# Altium footprint library HARTING THD.PcbLib: 113 footprints (part 7 of 11)
Each footprint in its own frame and in the unit in brackets; x right, y up, seen from the top. Pads: shape width x height; smd on the part's side, far side on the other; paste and mask are expansions set on the pad; w line width, h text height; cw(c..) or ccw(c..) is an arc to the next point about the centre after c.
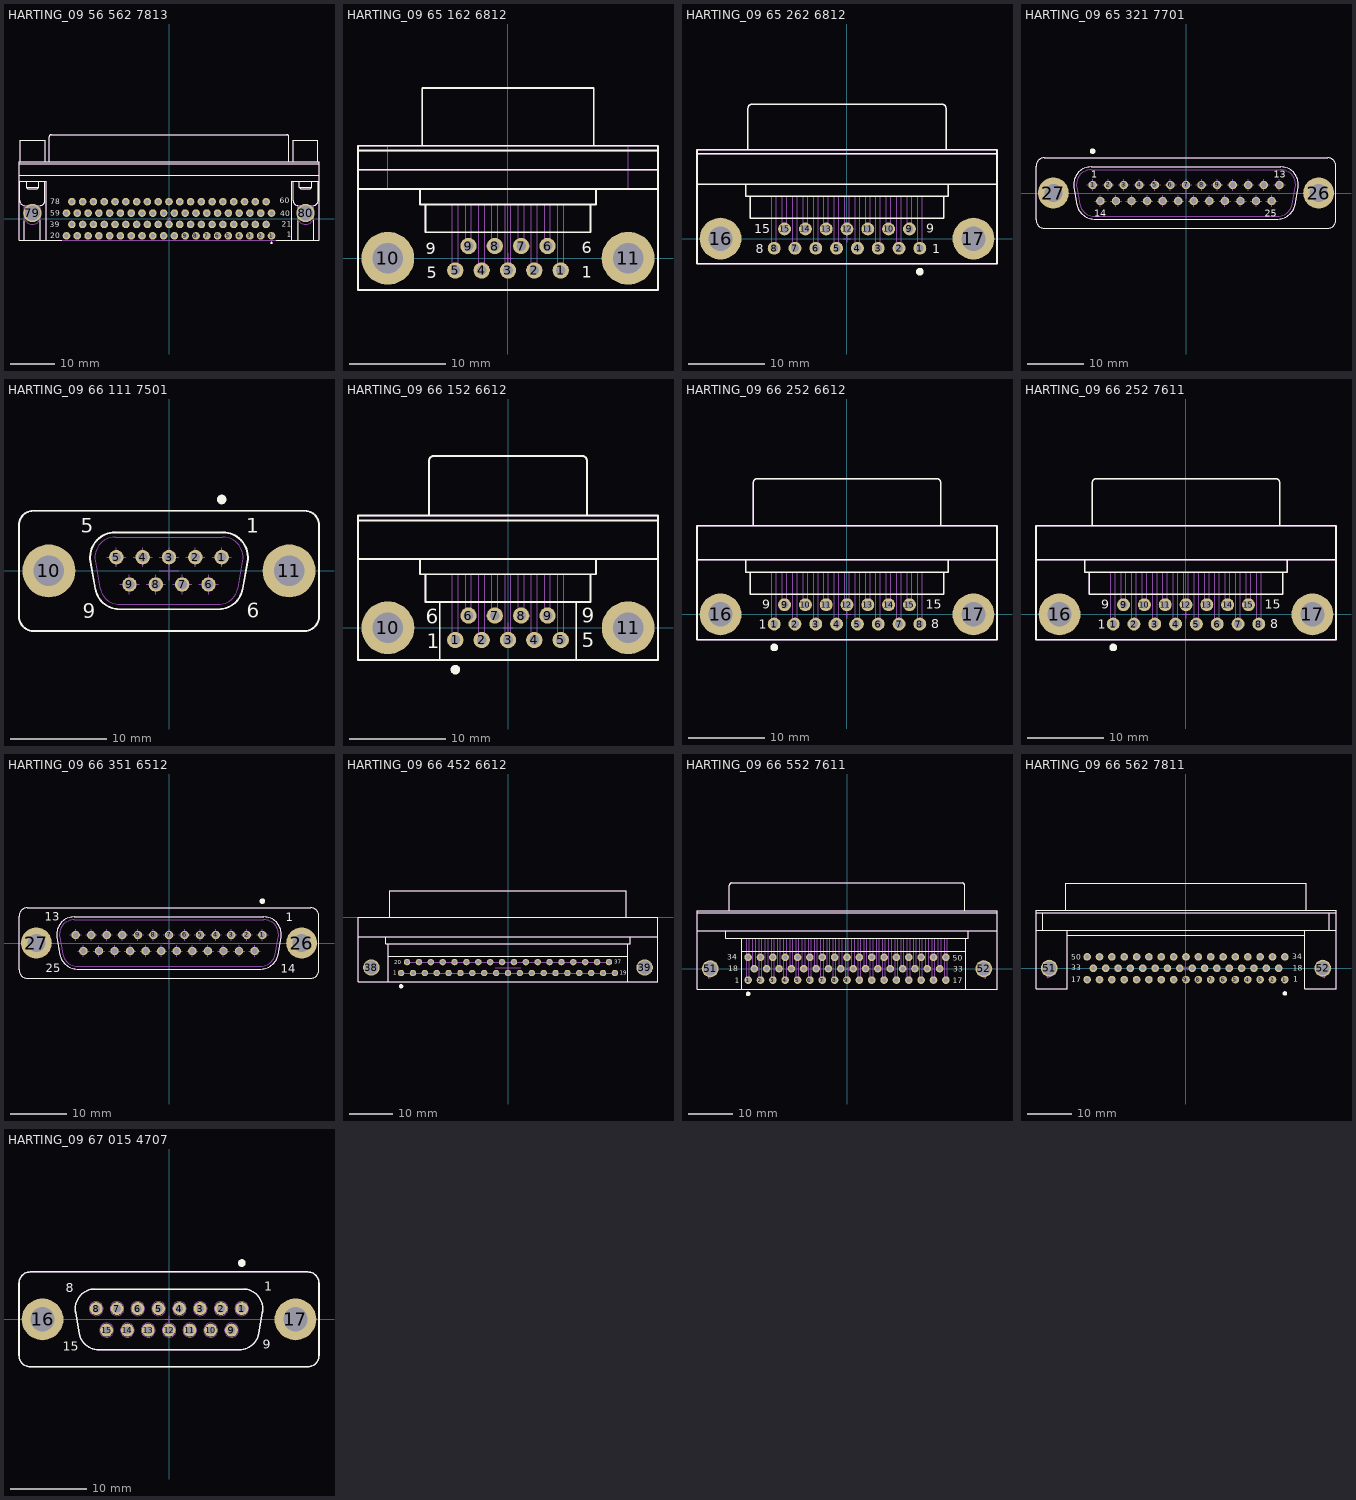
[diagram p6: the footprints below, top view; thin cyan lines are the x and y axes]

## HARTING_09 56 562 7813 [mm] "High Density Right Angle Male D-SUB 78 Contacts, with Grounding Board Locks and Female Screw Lock 4-40"
height 15.37
pads (80):
  round 1.7 hole 1: 1(22.895,-3.81) 2(20.485,-3.81) 3(18.075,-3.81) 4(15.665,-3.81) 5(13.255,-3.81) 6(10.845,-3.81) 7(8.435,-3.81) 8(6.025,-3.81) 9(3.615,-3.81) 10(1.205,-3.81) 11(-1.205,-3.81) 12(-3.615,-3.81) 13(-6.025,-3.81) 14(-8.435,-3.81) 15(-10.845,-3.81) 16(-13.255,-3.81) 17(-15.665,-3.81) 18(-18.075,-3.81) 19(-20.485,-3.81) 20(-22.895,-3.81) 21(21.685,-1.27) 22(19.275,-1.27) 23(16.865,-1.27) 24(14.455,-1.27) 25(12.045,-1.27) 26(9.635,-1.27) 27(7.225,-1.27) 28(4.815,-1.27) 29(2.405,-1.27) 30(-0.005,-1.27) 31(-2.415,-1.27) 32(-4.825,-1.27) 33(-7.235,-1.27) 34(-9.645,-1.27) 35(-12.055,-1.27) 36(-14.465,-1.27) 37(-16.875,-1.27) 38(-19.285,-1.27) 39(-21.695,-1.27) 40(22.895,1.27) 41(20.485,1.27) 42(18.075,1.27) 43(15.665,1.27) 44(13.255,1.27) 45(10.845,1.27) 46(8.435,1.27) 47(6.025,1.27) 48(3.615,1.27) 49(1.205,1.27) 50(-1.205,1.27) 51(-3.615,1.27) 52(-6.025,1.27) 53(-8.435,1.27) 54(-10.845,1.27) 55(-13.255,1.27) 56(-15.665,1.27) 57(-18.075,1.27) 58(-20.485,1.27) 59(-22.895,1.27) 60(21.685,3.81) 61(19.275,3.81) 62(16.865,3.81) 63(14.455,3.81) 64(12.045,3.81) 65(9.635,3.81) 66(7.225,3.81) 67(4.815,3.81) 68(2.405,3.81) 69(-0.005,3.81) 70(-2.415,3.81) 71(-4.825,3.81) 72(-7.235,3.81) 73(-9.645,3.81) 74(-12.055,3.81) 75(-14.465,3.81) 76(-16.875,3.81) 77(-19.285,3.81) 78(-21.695,3.81)
  round 4.1 hole 3.4: 79(-30.505,1.27) 80(30.495,1.27)
Top Overlay:
  circle w0.2: c22.895,-5.386 r0.125
  lines w0.2: -33.5,8.4 -27.45,8.4 -27.45,-4.8 ; -33.5,9.7 33.5,9.7 ; -33.5,12.3 33.5,12.3 ; -33.3,8.4 -33.3,4.02 ccw(c-32.3,4.02) -32.3,3.02 ; -33.243,12.7 -33.243,17.499 -27.758,17.499 -27.758,12.7 ; -32.3,-4.8 -32.3,-0.398 ; -31.9,8.4 -31.9,7 ; -29.1,8.4 -29.1,7 ; -28.7,-4.8 -28.7,-0.387 ; -28.7,3.02 ccw(c-28.7,4.02) -27.7,4.02 -27.7,8.4 ; -26.759,12.7 -26.759,18.3 cw(c-26.259,18.3) -26.259,18.8 26.259,18.8 cw(c26.259,18.3) 26.759,18.3 26.759,12.7 ; -23.925,-4.8 -33.5,-4.8 -33.5,12.7 33.5,12.7 33.5,-4.8 23.925,-4.8 ; 27.45,-4.8 27.45,8.4 33.5,8.4 ; 27.7,8.4 27.7,4.02 ccw(c28.7,4.02) 28.7,3.02 ; 27.757,12.7 27.757,17.499 33.242,17.499 33.242,12.7 ; 28.7,-4.8 28.7,-0.398 ; 29.1,8.4 29.1,7 ; 31.9,8.4 31.9,7 ; 32.3,-4.8 32.3,-0.387 ; 32.3,3.02 ccw(c32.3,4.02) 33.3,4.02 33.3,8.4 ; -31.9,7 -29.1,7 ; -31.9,7 -31.6,6.7 -29.4,6.7 -29.1,7 ; 29.1,7 29.4,6.7 31.6,6.7 31.9,7 ; 29.1,7 31.9,7
  text "20" at -26.479,-4.302 h1.2
  text "39" at -26.579,-1.877 h1.2
  text "21" at 25.171,-1.787 h1.2
  text "59" at -26.504,0.703 h1.2
  text "40" at 24.846,0.608 h1.2
  text "78" at -26.529,3.263 h1.2
  text "60" at 24.771,3.408 h1.2
  text "1" at 26.246,-4.132 h1.2
Mechanical 8:
  drawing of 327 lines, arcs and shapes, not listed
Mechanical 14:
  lines w0.1: -33.5,8.4 -27.45,8.4 -27.45,-4.8 ; -33.5,9.7 33.5,9.7 ; -33.5,12.3 33.5,12.3 ; -33.3,8.4 -33.3,4.02 ccw(c-32.3,4.02) -32.3,3.02 ; -33.243,12.7 -33.243,17.499 -27.758,17.499 -27.758,12.7 ; -32.3,-4.8 -32.3,3.02 ; -32.3,0.55 ccw(c-30.5,0.55) -28.7,0.55 ; -32.3,1.02 -28.7,1.02 ; -32.3,1.52 -32.01,1.52 ; -32.3,2.05 cw(c-30.5,2.05) -32.016,3.02 ; -32.01,1.02 -32.01,3.02 ; -31.9,8.4 -31.9,7 ; -29.1,8.4 -29.1,7 ; -28.99,1.02 -28.99,3.02 ; -28.99,1.52 -28.7,1.52 ; -28.984,3.02 cw(c-30.5,2.05) -28.7,2.05 ; -28.7,-4.8 -28.7,3.02 ; -27.7,8.4 -27.7,4.02 cw(c-28.7,4.02) -28.7,3.02 ; -26.759,12.7 -26.759,18.3 cw(c-26.259,18.3) -26.259,18.8 26.259,18.8 cw(c26.259,18.3) 26.759,18.3 26.759,12.7 ; 27.45,-4.8 27.45,8.4 33.5,8.4 ; 27.7,4.02 ccw(c28.7,4.02) 28.7,3.02 ; 27.757,12.7 27.757,17.499 33.242,17.499 33.242,12.7 ; 28.7,-4.8 28.7,3.02 ; 28.7,0.55 ccw(c30.5,0.55) 32.3,0.55 ; 28.7,1.02 32.3,1.02 ; 28.7,1.52 28.978,1.52 ; 28.7,2.05 cw(c30.5,2.05) 28.984,3.02 ; 28.99,1.02 28.99,3.02 ; 29.1,8.4 29.1,7 ; 31.9,8.4 31.9,7 ; 32.01,1.02 32.01,3.02 ; 32.016,3.02 cw(c30.5,2.05) 32.3,2.05 ; 32.021,1.52 32.3,1.52 ; 32.3,-4.8 32.3,3.02 ; 33.3,8.4 33.3,4.02 cw(c32.3,4.02) 32.3,3.02 ; -32.3,3.02 -28.7,3.02 ; -31.9,7 -29.1,7 ; -31.9,7 -31.6,6.7 -29.4,6.7 -29.1,7 ; 28.7,3.02 32.3,3.02 ; 29.1,7 29.4,6.7 31.6,6.7 31.9,7 ; 29.1,7 31.9,7 ; -33.5,-4.8 -33.5,12.7 33.5,12.7 33.5,-4.8 -33.5,-4.8
  text "20" at -26.479,-4.302 h1.2
  text "39" at -26.579,-1.877 h1.2
  text "21" at 25.171,-1.787 h1.2
  text "59" at -26.504,0.703 h1.2
  text "40" at 24.846,0.608 h1.2
  text "78" at -26.529,3.263 h1.2
  text "60" at 24.771,3.408 h1.2
  text "1" at 26.246,-4.132 h1.2
3D body "HARTING_09 56 562 7813.stp": height 15.37, standoff -4, extent -33.5,-4.8 33.5,18.8

## HARTING_09 65 162 6812 [mm] "Right Angled D-Sub 9 Male Contacts With Grounding Board Locks And UNC 4-40 Flange Thread"
height 13.6
pads (11):
  round 1.7 hole 1: 1(5.48,-1.27) 2(2.74,-1.27) 3(0,-1.27) 4(-2.74,-1.27) 5(-5.48,-1.27) 6(4.11,1.27) 7(1.37,1.27) 8(-1.37,1.27) 9(-4.11,1.27)
  round 5.5 hole 3.2: 10(-12.5,0) 11(12.5,0)
Top Overlay:
  lines w0.2: -15.6,7.2 15.6,7.2 ; -15.6,9.2 15.6,9.2 ; -15.6,11.2 15.6,11.2 ; -9.15,7.2 -9.15,5.6 9.15,5.6 9.15,7.2 ; -8.918,11.7 -8.918,17.7 8.92,17.7 8.92,11.7 ; -8.6,5.604 -8.6,2.7 8.6,2.7 8.6,5.6 ; -15.6,-3.3 -15.6,11.7 15.6,11.7 15.6,-3.3 -15.6,-3.3
  text "6" at 7.656,0.508 h1.2
  text "9" at -8.566,0.433 h1.2
  text "1" at 7.656,-2.032 h1.2
  text "5" at -8.439,-2.107 h1.2
Mechanical 8:
  lines w0.1: -13,0 -12.5,0 ; -12.5,-0.5 -12.5,0 ; -12.5,0.5 -12.5,0 ; -12.5,7.2 -12.5,11.7 ; -12,0 -12.5,0 ; -5.98,-1.27 -5.48,-1.27 ; -5.48,-1.77 -5.48,-1.27 ; -5.48,-0.77 -5.48,-1.27 ; -4.98,-1.27 -5.48,-1.27 ; -4.61,1.27 -4.11,1.27 ; -4.11,0.77 -4.11,1.27 ; -4.11,1.77 -4.11,1.27 ; -3.61,1.27 -4.11,1.27 ; -3.24,-1.27 -2.74,-1.27 ; -2.74,-1.77 -2.74,-1.27 ; -2.74,-0.77 -2.74,-1.27 ; -2.24,-1.27 -2.74,-1.27 ; -1.87,1.27 -1.37,1.27 ; -1.37,0.77 -1.37,1.27 ; -1.37,1.77 -1.37,1.27 ; -0.87,1.27 -1.37,1.27 ; -0.5,-1.27 0,-1.27 ; -0.5,0 0,0 ; 0,-1.77 0,-1.27 ; 0,-0.77 0,-1.27 ; 0,-0.5 0,0 ; 0,0.5 0,0 ; 0.5,-1.27 0,-1.27 ; 0.5,0 0,0 ; 0.87,1.27 1.37,1.27 ; 1.37,0.77 1.37,1.27 ; 1.37,1.77 1.37,1.27 ; 1.87,1.27 1.37,1.27 ; 2.24,-1.27 2.74,-1.27 ; 2.74,-1.77 2.74,-1.27 ; 2.74,-0.77 2.74,-1.27 ; 3.24,-1.27 2.74,-1.27 ; 3.61,1.27 4.11,1.27 ; 4.11,0.77 4.11,1.27 ; 4.11,1.77 4.11,1.27 ; 4.61,1.27 4.11,1.27 ; 4.98,-1.27 5.48,-1.27 ; 5.48,-1.77 5.48,-1.27 ; 5.48,-0.77 5.48,-1.27 ; 5.98,-1.27 5.48,-1.27 ; 12,0 12.5,0 ; 12.5,-0.5 12.5,0 ; 12.5,0.5 12.5,0 ; 12.5,7.2 12.5,11.7 ; 13,0 12.5,0
Mechanical 14:
  lines w0.1: -15.6,7.2 15.6,7.2 ; -15.6,9.2 15.6,9.2 ; -15.6,11.2 15.6,11.2 ; -9.15,7.2 -9.15,5.6 9.15,5.6 9.15,7.2 ; -8.918,11.7 -8.918,17.7 8.92,17.7 8.92,11.7 ; -8.6,5.604 -8.6,2.7 -5.78,2.7 ; -5.78,5.6 -5.78,-1.24 ccw(c-5.48,-1.24) -5.18,-1.24 -5.18,5.6 ; -5.18,2.7 -4.41,2.7 ; -4.41,5.6 -4.41,1.3 ccw(c-4.11,1.3) -3.81,1.3 -3.81,5.6 ; -3.81,2.7 -3.04,2.7 ; -3.04,5.6 -3.04,-1.24 ccw(c-2.74,-1.24) -2.44,-1.24 -2.44,5.6 ; -2.44,2.7 -1.67,2.7 ; -1.67,5.6 -1.67,1.3 ccw(c-1.37,1.3) -1.07,1.3 -1.07,5.6 ; -1.07,2.7 -0.3,2.7 ; -0.3,5.6 -0.3,-1.24 ccw(c0,-1.24) 0.3,-1.24 0.3,5.6 ; 0.3,2.7 1.07,2.7 ; 1.07,5.6 1.07,1.3 ccw(c1.37,1.3) 1.67,1.3 1.67,5.6 ; 1.67,2.7 2.44,2.7 ; 2.44,5.6 2.44,-1.24 ccw(c2.74,-1.24) 3.04,-1.24 3.04,5.6 ; 3.04,2.7 3.81,2.7 ; 3.81,5.6 3.81,1.3 ccw(c4.11,1.3) 4.41,1.3 4.41,5.6 ; 4.41,2.7 5.18,2.7 ; 5.18,5.6 5.18,-1.24 ccw(c5.48,-1.24) 5.78,-1.24 5.78,5.6 ; 5.78,2.7 8.6,2.7 8.6,5.6 ; -15.6,-3.3 -15.6,11.7 15.6,11.7 15.6,-3.3 -15.6,-3.3
  text "1" at 7.656,-2.032 h1.2
  text "6" at 7.656,0.508 h1.2
  text "9" at -8.566,0.433 h1.2
  text "5" at -8.439,-2.107 h1.2
3D body "HARTING_09 65 162 6812.stp": height 13.6, standoff -3.2, extent -15.6,-3.3 15.6,17.7

## HARTING_09 65 262 6812 [mm] "Right Angled D-Sub 15 Male Contacts With Grounding Board Locks And UNC 4-40 Flange Thread"
height 13.6
pads (17):
  round 1.7 hole 1: 1(9.59,-1.27) 2(6.85,-1.27) 3(4.11,-1.27) 4(1.37,-1.27) 5(-1.37,-1.27) 6(-4.11,-1.27) 7(-6.85,-1.27) 8(-9.59,-1.27) 9(8.22,1.27) 10(5.48,1.27) 11(2.74,1.27) 12(0,1.27) 13(-2.74,1.27) 14(-5.48,1.27) 15(-8.22,1.27)
  round 5.5 hole 3.2: 16(-16.65,0) 17(16.65,0)
Top Overlay:
  circle w0.5: c9.595,-4.355 r0.25
  lines w0.2: -19.75,11.17 19.75,11.17 ; -19.71,7.17 19.75,7.17 ; -13.3,7.17 -13.3,5.57 13.3,5.57 13.3,7.17 ; -13.038,11.67 -13.038,17.17 cw(c-12.542,17.174) -12.545,17.67 12.546,17.67 cw(c12.542,17.174) 13.038,17.17 13.038,11.67 ; -12.75,5.57 -12.75,2.67 12.75,2.67 12.75,5.57 ; -19.75,-3.33 19.75,-3.33 19.75,11.67 -19.75,11.67 -19.75,-3.33
  text "9" at 10.414,0.8 h1.2
  text "8" at -11.986,-1.9 h1.2
  text "15" at -12.18,0.7 h1.2
  text "1" at 11.252,-1.9 h1.2
Mechanical 8:
  lines w0.1: -17.15,0 -16.65,0 ; -16.65,-0.5 -16.65,0 ; -16.65,0.5 -16.65,0 ; -16.15,0 -16.65,0 ; -10.09,-1.27 -9.59,-1.27 ; -9.59,-1.77 -9.59,-1.27 ; -9.59,-0.77 -9.59,-1.27 ; -9.09,-1.27 -9.59,-1.27 ; -8.72,1.27 -8.22,1.27 ; -8.22,0.77 -8.22,1.27 ; -8.22,1.77 -8.22,1.27 ; -7.72,1.27 -8.22,1.27 ; -7.35,-1.27 -6.85,-1.27 ; -6.85,-1.77 -6.85,-1.27 ; -6.85,-0.77 -6.85,-1.27 ; -6.35,-1.27 -6.85,-1.27 ; -5.98,1.27 -5.48,1.27 ; -5.48,0.77 -5.48,1.27 ; -5.48,1.77 -5.48,1.27 ; -4.98,1.27 -5.48,1.27 ; -4.61,-1.27 -4.11,-1.27 ; -4.11,-1.77 -4.11,-1.27 ; -4.11,-0.77 -4.11,-1.27 ; -3.61,-1.27 -4.11,-1.27 ; -3.24,1.27 -2.74,1.27 ; -2.74,0.77 -2.74,1.27 ; -2.74,1.77 -2.74,1.27 ; -2.24,1.27 -2.74,1.27 ; -1.87,-1.27 -1.37,-1.27 ; -1.37,-1.77 -1.37,-1.27 ; -1.37,-0.77 -1.37,-1.27 ; -0.87,-1.27 -1.37,-1.27 ; -0.5,0 0,0 ; -0.5,1.27 0,1.27 ; 0,-0.5 0,0 ; 0,0.5 0,0 ; 0,0.77 0,1.27 ; 0,1.77 0,1.27 ; 0.5,0 0,0 ; 0.5,1.27 0,1.27 ; 0.87,-1.27 1.37,-1.27 ; 1.37,-1.77 1.37,-1.27 ; 1.37,-0.77 1.37,-1.27 ; 1.87,-1.27 1.37,-1.27 ; 2.24,1.27 2.74,1.27 ; 2.74,0.77 2.74,1.27 ; 2.74,1.77 2.74,1.27 ; 3.24,1.27 2.74,1.27 ; 3.61,-1.27 4.11,-1.27 ; 4.11,-1.77 4.11,-1.27 ; 4.11,-0.77 4.11,-1.27 ; 4.61,-1.27 4.11,-1.27 ; 4.98,1.27 5.48,1.27 ; 5.48,0.77 5.48,1.27 ; 5.48,1.77 5.48,1.27 ; 5.98,1.27 5.48,1.27 ; 6.35,-1.27 6.85,-1.27 ; 6.85,-1.77 6.85,-1.27 ; 6.85,-0.77 6.85,-1.27 ; 7.35,-1.27 6.85,-1.27 ; 7.72,1.27 8.22,1.27 ; 8.22,0.77 8.22,1.27 ; 8.22,1.77 8.22,1.27 ; 8.72,1.27 8.22,1.27 ; 9.09,-1.27 9.59,-1.27 ; 9.59,-1.77 9.59,-1.27 ; 9.59,-0.77 9.59,-1.27 ; 10.09,-1.27 9.59,-1.27 ; 16.15,0 16.65,0 ; 16.65,-0.5 16.65,0 ; 16.65,0.5 16.65,0 ; 17.15,0 16.65,0
Mechanical 14:
  lines w0.1: -19.75,11.17 19.75,11.17 ; -19.71,7.17 19.75,7.17 ; -13.3,7.17 -13.3,5.57 13.3,5.57 13.3,7.17 ; -13.038,11.67 -13.038,17.17 cw(c-12.542,17.174) -12.545,17.67 12.546,17.67 cw(c12.542,17.174) 13.038,17.17 13.038,11.67 ; -12.75,5.57 -12.75,2.67 -9.89,2.67 ; -9.89,5.57 -9.89,-1.27 ccw(c-9.59,-1.27) -9.29,-1.27 -9.29,5.57 ; -9.29,2.67 -8.52,2.67 ; -8.52,5.57 -8.52,1.27 ccw(c-8.22,1.27) -7.92,1.27 -7.92,5.57 ; -7.92,2.67 -7.15,2.67 ; -7.15,5.57 -7.15,-1.27 ccw(c-6.85,-1.27) -6.55,-1.27 -6.55,5.57 ; -6.55,2.67 -5.78,2.67 ; -5.78,5.57 -5.78,1.27 ccw(c-5.48,1.27) -5.18,1.27 -5.18,5.57 ; -5.18,2.67 -4.41,2.67 ; -4.41,5.57 -4.41,-1.27 ccw(c-4.11,-1.27) -3.81,-1.27 -3.81,5.57 ; -3.81,2.67 -3.04,2.67 ; -3.04,5.57 -3.04,1.27 ccw(c-2.74,1.27) -2.44,1.27 -2.44,5.57 ; -2.44,2.67 -1.67,2.67 ; -1.67,5.57 -1.67,-1.27 ccw(c-1.37,-1.27) -1.07,-1.27 -1.07,5.57 ; -1.07,2.67 -0.3,2.67 ; -0.3,5.57 -0.3,1.27 ccw(c0,1.27) 0.3,1.27 0.3,5.57 ; 0.3,2.67 1.07,2.67 ; 1.07,5.57 1.07,-1.27 ccw(c1.37,-1.27) 1.67,-1.27 1.67,5.57 ; 1.67,2.67 2.44,2.67 ; 2.44,5.57 2.44,1.27 ccw(c2.74,1.27) 3.04,1.27 3.04,5.57 ; 3.04,2.67 3.81,2.67 ; 3.81,5.57 3.81,-1.27 ccw(c4.11,-1.27) 4.41,-1.27 4.41,5.57 ; 4.41,2.67 5.18,2.67 ; 5.18,5.57 5.18,1.27 ccw(c5.48,1.27) 5.78,1.27 5.78,5.57 ; 5.78,2.67 6.55,2.67 ; 6.55,5.57 6.55,-1.27 ccw(c6.85,-1.27) 7.15,-1.27 7.15,5.57 ; 7.15,2.67 7.92,2.67 ; 7.92,5.57 7.92,1.27 ccw(c8.22,1.27) 8.52,1.27 8.52,5.57 ; 8.52,2.67 9.29,2.67 ; 9.29,5.57 9.29,-1.27 ccw(c9.59,-1.27) 9.89,-1.27 9.89,5.57 ; 9.89,2.67 12.75,2.67 12.75,5.57 ; -19.75,-3.33 19.75,-3.33 19.75,11.67 -19.75,11.67 -19.75,-3.33
  text "9" at 10.414,0.8 h1.2
  text "8" at -11.986,-1.9 h1.2
  text "15" at -12.18,0.7 h1.2
  text "1" at 11.252,-1.9 h1.2
3D body "HARTING_09 65 262 6812.stp": height 13.6, standoff -3.2, extent -19.75,-3.33 19.75,17.67

## HARTING_09 65 321 7701 [mm] "Straight D-Sub 25 Male Contacts with M3 Nut Thread"
height 12.2
pads (27):
  round 1.5 hole 1: 1(-16.56,1.42) 2(-13.8,1.42) 3(-11.04,1.42) 4(-8.28,1.42) 5(-5.52,1.42) 6(-2.76,1.42) 7(0,1.42) 8(2.76,1.42) 9(5.52,1.42) 10(8.28,1.42) 11(11.04,1.42) 12(13.8,1.42) 13(16.56,1.42) 14(-15.18,-1.42) 15(-12.42,-1.42) 16(-9.66,-1.42) 17(-6.9,-1.42) 18(-4.14,-1.42) 19(-1.38,-1.42) 20(1.38,-1.42) 21(4.14,-1.42) 22(6.9,-1.42) 23(9.66,-1.42) 24(12.42,-1.42) 25(15.18,-1.42)
  round 5.5 hole 3.2: 26(23.52,0) 27(-23.52,0)
Top Overlay:
  circle w0.5: c-16.56,7.42 r0.25
  lines w0.2: -26.6,-4.75 ccw(c-25.1,-4.75) -25.1,-6.25 25.1,-6.25 ccw(c25.1,-4.75) 26.6,-4.75 26.6,4.75 ccw(c25.1,4.75) 25.1,6.25 -25.1,6.25 ccw(c-25.1,4.75) -26.6,4.75 -26.6,-4.75 ; -19.883,0.977 cw(c-16.83,1.515) -16.83,4.615 16.83,4.615 cw(c16.83,1.515) 19.883,0.977 19.349,-2.053 cw(c16.296,-1.515) 16.296,-4.615 -16.296,-4.615 cw(c-16.296,-1.515) -19.349,-2.053 -19.883,0.977
  text "13" at 15.6,2.7 h1.2
  text "14" at -16.3,-4.2 h1.2
  text "1" at -16.8,2.7 h1.2
  text "25" at 14,-4.2 h1.2
Mechanical 8:
  lines w0.1: -24.52,0 -23.52,0 ; -23.52,-1 -23.52,0 ; -23.52,1 -23.52,0 ; -22.52,0 -23.52,0 ; -17.56,1.42 -16.56,1.42 ; -16.56,0.42 -16.56,1.42 ; -16.56,2.42 -16.56,1.42 ; -16.18,-1.42 -15.18,-1.42 ; -15.56,1.42 -16.56,1.42 ; -15.18,-2.42 -15.18,-1.42 ; -15.18,-0.42 -15.18,-1.42 ; -14.8,1.42 -13.8,1.42 ; -14.18,-1.42 -15.18,-1.42 ; -13.8,0.42 -13.8,1.42 ; -13.8,2.42 -13.8,1.42 ; -13.42,-1.42 -12.42,-1.42 ; -12.8,1.42 -13.8,1.42 ; -12.42,-2.42 -12.42,-1.42 ; -12.42,-0.42 -12.42,-1.42 ; -12.04,1.42 -11.04,1.42 ; -11.42,-1.42 -12.42,-1.42 ; -11.04,0.42 -11.04,1.42 ; -11.04,2.42 -11.04,1.42 ; -10.66,-1.42 -9.66,-1.42 ; -10.04,1.42 -11.04,1.42 ; -9.66,-2.42 -9.66,-1.42 ; -9.66,-0.42 -9.66,-1.42 ; -9.28,1.42 -8.28,1.42 ; -8.66,-1.42 -9.66,-1.42 ; -8.28,0.42 -8.28,1.42 ; -8.28,2.42 -8.28,1.42 ; -7.9,-1.42 -6.9,-1.42 ; -7.28,1.42 -8.28,1.42 ; -6.9,-2.42 -6.9,-1.42 ; -6.9,-0.42 -6.9,-1.42 ; -6.52,1.42 -5.52,1.42 ; -5.9,-1.42 -6.9,-1.42 ; -5.52,0.42 -5.52,1.42 ; -5.52,2.42 -5.52,1.42 ; -5.14,-1.42 -4.14,-1.42 ; -4.52,1.42 -5.52,1.42 ; -4.14,-2.42 -4.14,-1.42 ; -4.14,-0.42 -4.14,-1.42 ; -3.76,1.42 -2.76,1.42 ; -3.14,-1.42 -4.14,-1.42 ; -2.76,0.42 -2.76,1.42 ; -2.76,2.42 -2.76,1.42 ; -2.38,-1.42 -1.38,-1.42 ; -1.76,1.42 -2.76,1.42 ; -1.38,-2.42 -1.38,-1.42 ; -1.38,-0.42 -1.38,-1.42 ; -1,0 0,0 ; -1,1.42 0,1.42 ; -0.38,-1.42 -1.38,-1.42 ; 0,-1 0,0 ; 0,0.42 0,1.42 ; 0,1 0,0 ; 0,2.42 0,1.42 ; 0.38,-1.42 1.38,-1.42 ; 1,0 0,0 ; 1,1.42 0,1.42 ; 1.38,-2.42 1.38,-1.42 ; 1.38,-0.42 1.38,-1.42 ; 1.76,1.42 2.76,1.42 ; 2.38,-1.42 1.38,-1.42 ; 2.76,0.42 2.76,1.42 ; 2.76,2.42 2.76,1.42 ; 3.14,-1.42 4.14,-1.42 ; 3.76,1.42 2.76,1.42 ; 4.14,-2.42 4.14,-1.42 ; 4.14,-0.42 4.14,-1.42 ; 4.52,1.42 5.52,1.42 ; 5.14,-1.42 4.14,-1.42 ; 5.52,0.42 5.52,1.42 ; 5.52,2.42 5.52,1.42 ; 5.9,-1.42 6.9,-1.42 ; 6.52,1.42 5.52,1.42 ; 6.9,-2.42 6.9,-1.42 ; 6.9,-0.42 6.9,-1.42 ; 7.28,1.42 8.28,1.42 ; 7.9,-1.42 6.9,-1.42 ; 8.28,0.42 8.28,1.42 ; 8.28,2.42 8.28,1.42 ; 8.66,-1.42 9.66,-1.42 ; 9.28,1.42 8.28,1.42 ; 9.66,-2.42 9.66,-1.42 ; 9.66,-0.42 9.66,-1.42 ; 10.04,1.42 11.04,1.42 ; 10.66,-1.42 9.66,-1.42 ; 11.04,0.42 11.04,1.42 ; 11.04,2.42 11.04,1.42 ; 11.42,-1.42 12.42,-1.42 ; 12.04,1.42 11.04,1.42 ; 12.42,-2.42 12.42,-1.42 ; 12.42,-0.42 12.42,-1.42 ; 12.8,1.42 13.8,1.42 ; 13.42,-1.42 12.42,-1.42 ; 13.8,0.42 13.8,1.42 ; 13.8,2.42 13.8,1.42 ; 14.18,-1.42 15.18,-1.42 ; 14.8,1.42 13.8,1.42 ; 15.18,-2.42 15.18,-1.42 ; 15.18,-0.42 15.18,-1.42 ; 15.56,1.42 16.56,1.42 ; 16.18,-1.42 15.18,-1.42 ; 16.56,0.42 16.56,1.42 ; 16.56,2.42 16.56,1.42 ; 17.56,1.42 16.56,1.42 ; 22.52,0 23.52,0 ; 23.52,-1 23.52,0 ; 23.52,1 23.52,0 ; 24.52,0 23.52,0
Mechanical 14:
  circle w0.1: c23.52,0 r1.5
  circle w0.1: c-23.52,0 r1.5
  lines w0.1: -26.6,-4.75 ccw(c-25.1,-4.75) -25.1,-6.25 25.1,-6.25 ccw(c25.1,-4.75) 26.6,-4.75 26.6,4.75 ccw(c25.1,4.75) 25.1,6.25 -25.1,6.25 ccw(c-25.1,4.75) -26.6,4.75 -26.6,-4.75 ; -19.883,0.977 cw(c-16.83,1.515) -16.83,4.615 16.83,4.615 cw(c16.83,1.515) 19.883,0.977 19.349,-2.053 cw(c16.296,-1.515) 16.296,-4.615 -16.296,-4.615 cw(c-16.296,-1.515) -19.349,-2.053 -19.883,0.977 ; -19.391,1.064 cw(c-16.83,1.515) -16.83,4.115 16.83,4.115 cw(c16.83,1.515) 19.391,1.064 18.856,-1.966 cw(c16.296,-1.515) 16.296,-4.115 -16.296,-4.115 cw(c-16.296,-1.515) -18.856,-1.966 -19.391,1.064
3D body "HARTING_09 65 321 7701.stp": height 12.2, standoff -4, extent -26.6,-6.25 26.6,6.25

## HARTING_09 66 111 7501 [mm] "Straight D-SUB 9 Female Contacts with M3 Nut Thread"
height 12.33
pads (11):
  round 1.5 hole 1: 1(5.48,1.42) 2(2.74,1.42) 3(0,1.42) 4(-2.74,1.42) 5(-5.48,1.42) 6(4.11,-1.42) 7(1.37,-1.42) 8(-1.37,-1.42) 9(-4.11,-1.42)
  round 5.5 hole 3.2: 10(-12.495,0) 11(12.495,0)
Top Overlay:
  circle w0.5: c5.48,7.42 r0.25
  lines w0.2: -15.6,-4.75 ccw(c-14.1,-4.75) -14.1,-6.25 14.1,-6.25 ccw(c14.1,-4.75) 15.6,-4.75 15.6,4.75 ccw(c14.1,4.75) 14.1,6.25 -14.1,6.25 ccw(c-14.1,4.75) -15.6,4.75 -15.6,-4.75 ; -8.166,0.949 cw(c-5.605,1.4) -5.605,4 5.605,4 cw(c5.605,1.4) 8.166,0.949 7.672,-1.851 cw(c5.111,-1.4) 5.111,-4 -5.111,-4 cw(c-5.111,-1.4) -7.672,-1.851 -8.166,0.949
  text "5" at -9.2,3.975 h1.5
  text "1" at 8.05,3.975 h1.5
  text "6" at 8.1,-4.9 h1.5
  text "9" at -8.975,-4.95 h1.5
Mechanical 8:
  lines w0.1: -6.48,1.42 -5.48,1.42 ; -5.48,0.42 -5.48,1.42 ; -5.48,2.42 -5.48,1.42 ; -5.11,-1.42 -4.11,-1.42 ; -4.48,1.42 -5.48,1.42 ; -4.11,-2.42 -4.11,-1.42 ; -4.11,-0.42 -4.11,-1.42 ; -3.74,1.42 -2.74,1.42 ; -3.11,-1.42 -4.11,-1.42 ; -2.74,0.42 -2.74,1.42 ; -2.74,2.42 -2.74,1.42 ; -2.37,-1.42 -1.37,-1.42 ; -1.74,1.42 -2.74,1.42 ; -1.37,-2.42 -1.37,-1.42 ; -1.37,-0.42 -1.37,-1.42 ; -1,0 0,0 ; -1,1.42 0,1.42 ; -0.37,-1.42 -1.37,-1.42 ; 0,-1 0,0 ; 0,0.42 0,1.42 ; 0,1 0,0 ; 0,2.42 0,1.42 ; 0.37,-1.42 1.37,-1.42 ; 1,0 0,0 ; 1,1.42 0,1.42 ; 1.37,-2.42 1.37,-1.42 ; 1.37,-0.42 1.37,-1.42 ; 1.74,1.42 2.74,1.42 ; 2.37,-1.42 1.37,-1.42 ; 2.74,0.42 2.74,1.42 ; 2.74,2.42 2.74,1.42 ; 3.11,-1.42 4.11,-1.42 ; 3.74,1.42 2.74,1.42 ; 4.11,-2.42 4.11,-1.42 ; 4.11,-0.42 4.11,-1.42 ; 4.48,1.42 5.48,1.42 ; 5.11,-1.42 4.11,-1.42 ; 5.48,0.42 5.48,1.42 ; 5.48,2.42 5.48,1.42 ; 6.48,1.42 5.48,1.42
Mechanical 14:
  circle w0.1: c12.5,0 r1.5
  circle w0.1: c-12.5,0 r1.5
  lines w0.1: -15.6,-4.75 ccw(c-14.1,-4.75) -14.1,-6.25 14.1,-6.25 ccw(c14.1,-4.75) 15.6,-4.75 15.6,4.75 ccw(c14.1,4.75) 14.1,6.25 -14.1,6.25 ccw(c-14.1,4.75) -15.6,4.75 -15.6,-4.75 ; -8.166,0.949 cw(c-5.605,1.4) -5.605,4 5.605,4 cw(c5.605,1.4) 8.166,0.949 7.672,-1.851 cw(c5.111,-1.4) 5.111,-4 -5.111,-4 cw(c-5.111,-1.4) -7.672,-1.851 -8.166,0.949 ; -7.673,1.035 cw(c-5.605,1.4) -5.605,3.5 5.605,3.5 cw(c5.605,1.4) 7.673,1.035 7.179,-1.765 cw(c5.111,-1.4) 5.111,-3.5 -5.111,-3.5 cw(c-5.111,-1.4) -7.179,-1.765 -7.673,1.035
  text "9" at -8.975,-4.95 h1.5
  text "6" at 8.1,-4.9 h1.5
  text "1" at 8.05,3.975 h1.5
  text "5" at -9.2,3.975 h1.5
3D body "HARTING_09 66 111 7501.stp": height 12.33, standoff -4, extent -15.6,-6.25 15.6,6.25

## HARTING_09 66 152 6612 [mm] "Right Angled D-Sub 9 Female Contacts With Grounding Board Locks And UNC 4-40 Flange"
height 13.6
pads (11):
  round 1.7 hole 1: 1(-5.48,-1.27) 2(-2.74,-1.27) 3(0,-1.27) 4(2.74,-1.27) 5(5.48,-1.27) 6(-4.11,1.27) 7(-1.37,1.27) 8(1.37,1.27) 9(4.11,1.27)
  round 5.5 hole 3.2: 10(-12.5,0) 11(12.5,0)
Top Overlay:
  circle w0.5: c-5.475,-4.355 r0.25
  lines w0.2: -15.6,7.17 15.6,7.17 ; -15.6,11.17 15.6,11.17 ; -9.15,7.17 -9.15,5.57 9.15,5.57 9.15,7.17 ; -8.6,5.57 -8.6,2.67 8.6,2.67 8.6,5.57 ; -8.205,11.67 -8.205,17.37 cw(c-7.705,17.37) -7.705,17.87 7.704,17.87 cw(c7.704,17.37) 8.204,17.37 8.204,11.67 ; -7.1,-3.33 -7.1,2.67 ; 7.1,-3.33 7.1,2.67 ; -15.6,-3.33 -15.6,11.67 15.6,11.67 15.6,-3.33 -15.6,-3.33
  text "1" at -8.439,-2.107 h1.5
  text "5" at 7.656,-2.032 h1.5
  text "6" at -8.566,0.433 h1.5
  text "9" at 7.656,0.508 h1.5
Mechanical 8:
  lines w0.1: -13,0 -12.5,0 ; -12.5,-0.5 -12.5,0 ; -12.5,0.5 -12.5,0 ; -12,0 -12.5,0 ; -5.98,-1.27 -5.48,-1.27 ; -5.48,-1.77 -5.48,-1.27 ; -5.48,-0.77 -5.48,-1.27 ; -4.98,-1.27 -5.48,-1.27 ; -4.61,1.27 -4.11,1.27 ; -4.11,0.77 -4.11,1.27 ; -4.11,1.77 -4.11,1.27 ; -3.61,1.27 -4.11,1.27 ; -3.24,-1.27 -2.74,-1.27 ; -2.74,-1.77 -2.74,-1.27 ; -2.74,-0.77 -2.74,-1.27 ; -2.24,-1.27 -2.74,-1.27 ; -1.87,1.27 -1.37,1.27 ; -1.37,0.77 -1.37,1.27 ; -1.37,1.77 -1.37,1.27 ; -0.87,1.27 -1.37,1.27 ; -0.5,-1.27 0,-1.27 ; -0.5,0 0,0 ; 0,-1.77 0,-1.27 ; 0,-0.77 0,-1.27 ; 0,-0.5 0,0 ; 0,0.5 0,0 ; 0.5,-1.27 0,-1.27 ; 0.5,0 0,0 ; 0.87,1.27 1.37,1.27 ; 1.37,0.77 1.37,1.27 ; 1.37,1.77 1.37,1.27 ; 1.87,1.27 1.37,1.27 ; 2.24,-1.27 2.74,-1.27 ; 2.74,-1.77 2.74,-1.27 ; 2.74,-0.77 2.74,-1.27 ; 3.24,-1.27 2.74,-1.27 ; 3.61,1.27 4.11,1.27 ; 4.11,0.77 4.11,1.27 ; 4.11,1.77 4.11,1.27 ; 4.61,1.27 4.11,1.27 ; 4.98,-1.27 5.48,-1.27 ; 5.48,-1.77 5.48,-1.27 ; 5.48,-0.77 5.48,-1.27 ; 5.98,-1.27 5.48,-1.27 ; 12,0 12.5,0 ; 12.5,-0.5 12.5,0 ; 12.5,0.5 12.5,0 ; 13,0 12.5,0
Mechanical 14:
  circle w0.1: c12.5,0 r1.6
  circle w0.1: c-12.5,0 r1.6
  lines w0.1: -15.6,7.17 15.6,7.17 ; -15.6,11.17 15.6,11.17 ; -9.15,7.17 -9.15,5.57 9.15,5.57 9.15,7.17 ; -8.6,5.57 -8.6,2.67 -5.78,2.67 ; -8.205,11.67 -8.205,17.37 cw(c-7.705,17.37) -7.705,17.87 7.704,17.87 cw(c7.704,17.37) 8.204,17.37 8.204,11.67 ; -7.1,-3.33 -7.1,2.67 ; -5.78,5.57 -5.78,-1.27 ccw(c-5.48,-1.27) -5.18,-1.27 -5.18,5.57 ; -5.18,2.67 -4.41,2.67 ; -4.409,5.57 -4.41,1.27 ccw(c-4.11,1.27) -3.81,1.27 -3.81,5.57 ; -3.81,2.67 -3.04,2.67 ; -3.04,5.57 -3.04,-1.27 ccw(c-2.74,-1.27) -2.44,-1.27 -2.44,5.57 ; -2.44,2.67 -1.67,2.67 ; -1.669,5.57 -1.67,1.27 ccw(c-1.37,1.27) -1.07,1.27 -1.07,5.57 ; -1.07,2.67 -0.3,2.67 ; -0.3,5.57 -0.3,-1.27 ccw(c0,-1.27) 0.3,-1.27 0.3,5.57 ; 0.3,2.67 1.07,2.67 ; 1.071,5.57 1.07,1.27 ccw(c1.37,1.27) 1.67,1.27 1.67,5.57 ; 1.67,2.67 2.44,2.67 ; 2.44,5.57 2.44,-1.27 ccw(c2.74,-1.27) 3.04,-1.27 3.04,5.57 ; 3.04,2.67 3.81,2.67 ; 3.811,5.57 3.81,1.27 ccw(c4.11,1.27) 4.41,1.27 4.41,5.57 ; 4.41,2.67 5.18,2.67 ; 5.18,5.57 5.18,-1.27 ccw(c5.48,-1.27) 5.78,-1.27 5.78,5.57 ; 5.78,2.67 8.6,2.67 8.6,5.57 ; 7.1,-3.33 7.1,2.67 ; -15.6,-3.33 -15.6,11.67 15.6,11.67 15.6,-3.33 -15.6,-3.33